# Altium footprint library TranDangKhoa-LIB.PcbLib: 1435 footprints (part 35 of 90)
Each footprint in its own frame and in the unit in brackets; x right, y up, seen from the top. Pads: shape width x height; smd on the part's side, far side on the other; paste and mask are expansions set on the pad; w line width, h text height; cw(c..) or ccw(c..) is an arc to the next point about the centre after c.
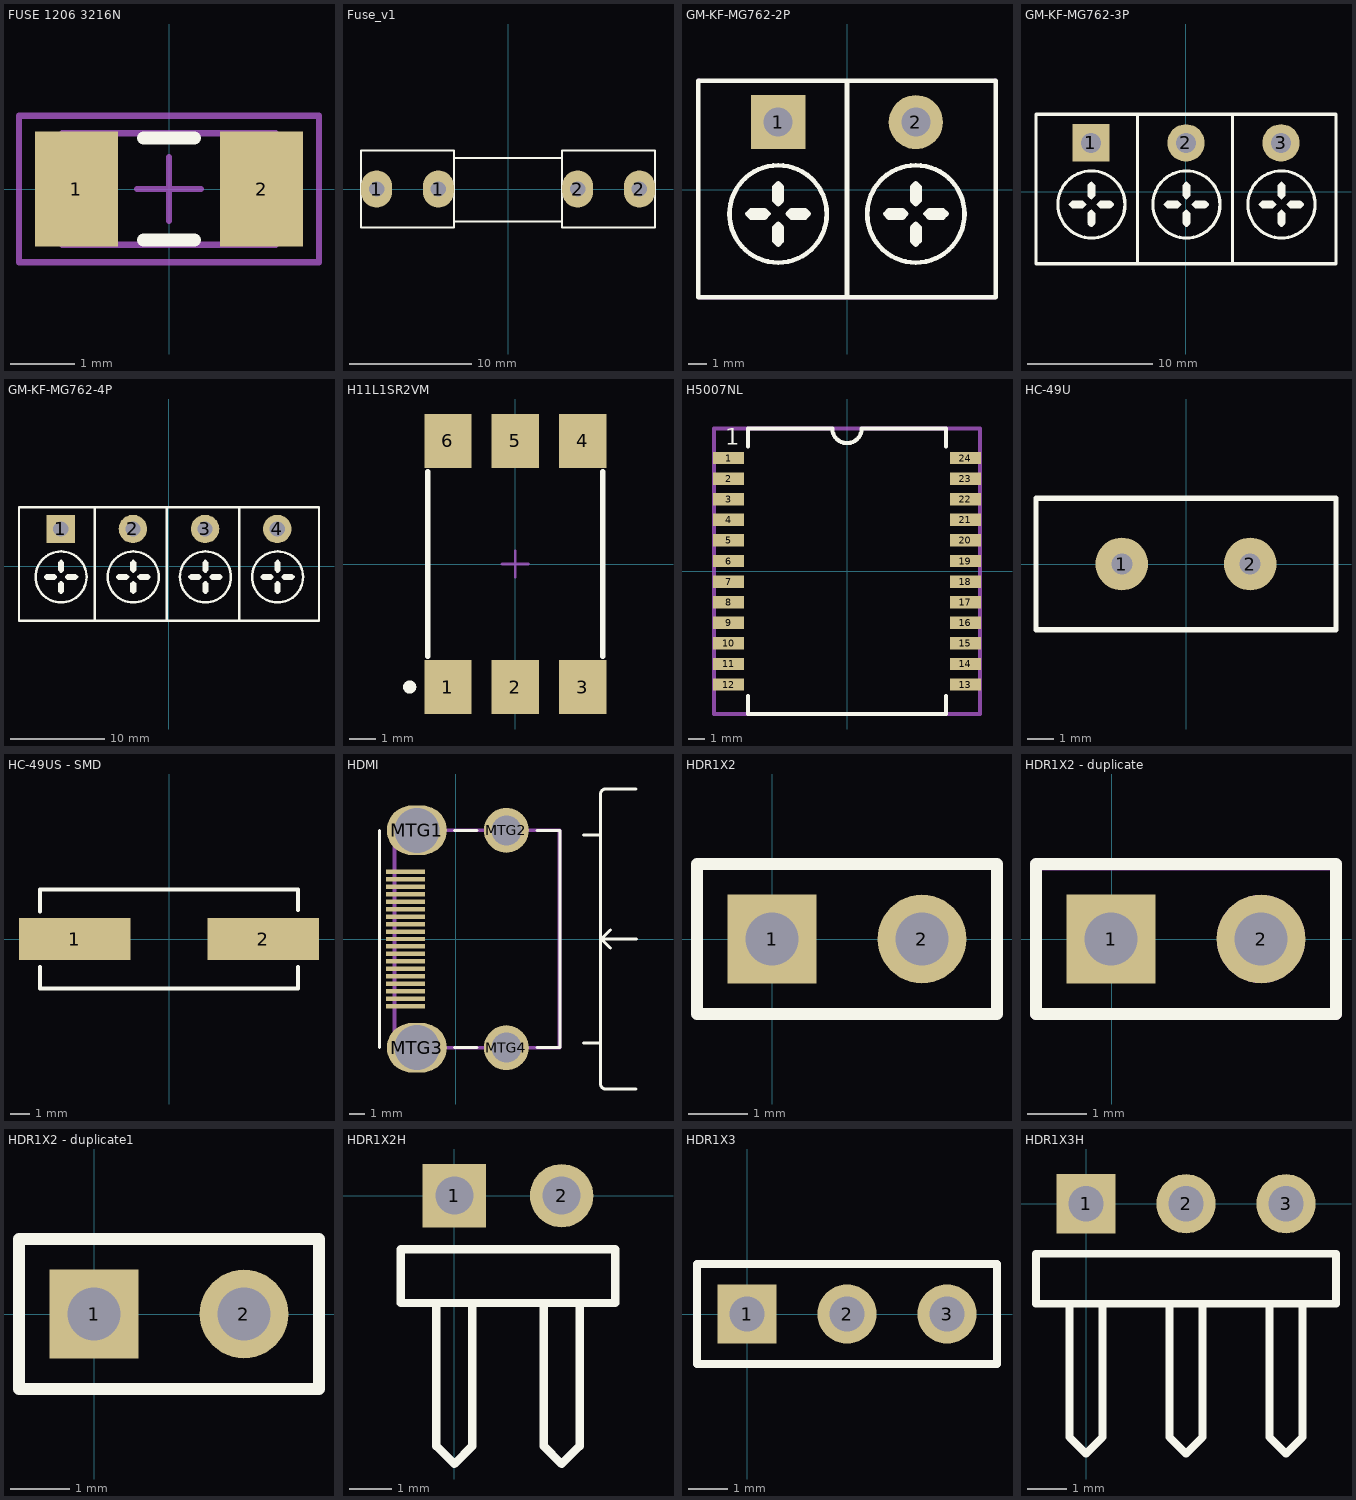
[diagram p34: the footprints below, top view; thin cyan lines are the x and y axes]

## FUSE 1206 3216N [mm] "Chip FUSE Body 3.2x1.6mm, IPC Medium Density"
height 0.71
pads (2):
  rect 1.3x1.8 smd: 1(-1.45,0) 2(1.45,0)
Top Overlay:
  lines w0.2: -0.4,-0.8 0.4,-0.8 ; -0.4,0.8 0.4,0.8
Mechanical 13:
  lines w0.1: -1.675,-0.875 1.675,-0.875 1.675,0.875 -1.675,0.875 -1.675,-0.875
Mechanical 15:
  lines w0.1: -0.5,0 0.5,0 ; 0,-0.5 0,0.5 ; -2.35,-1.15 2.35,-1.15 2.35,1.15 -2.35,1.15 -2.35,-1.15
3D body "1206 SMD Resistor.step": height 1, standoff 0, extent -1.571,-0.804 1.629,0.796

## Fuse_v1 [mil] "Fuse 10A, Cầu Chì, Fuse"
pads (4):
  oval 100x120 hole 50: 1(-425,0) 1(-225,0) 2(225,0) 2(425,0)
Top Overlay:
  lines w7: -175,-105 175,-105 ; -175,100 175,100 ; -475,-125 -475,125 -175,125 -175,-125 -475,-125 ; 175,-125 475,-125 475,125 175,125 175,-125
3D body "SW3dPS-Fuse Leg_2009.STEP": height 377.88, standoff -129.94, extent 219,-116.71 459,127
3D body "SW3dPS-Fuse Small 1A.STEP": height 370.39, standoff 169.61, extent -384.8,-98 390.8,102.79
3D body "SW3dPS-Fuse Leg_2009.STEP": height 377.88, standoff -129.94, extent -448,-117 -208,126.71

## GM-KF-MG762-2P [mm]
pads (2):
  rect 3x3 hole 1.6 paste-2539.97 mask+0.051: 1(-3.81,3.736)
  round 3 hole 1.6 paste-2539.97 mask+0.051: 2(3.81,3.736)
Top Overlay:
  circle w0.254: c3.81,-1.343 r2.693
  circle w0.254: c-3.81,-1.343 r2.693
  lines w0.254: -5.31,-1.144 -4.546,-1.144 -4.346,-1.343 ; -4.01,-2.843 -4.01,-2.079 -3.81,-1.879 ; -3.81,0.357 -4.01,0.156 -4.01,-0.608 -3.81,-0.808 ; -3.61,0.156 -3.61,-0.608 ; -2.111,-1.343 -2.309,-1.544 -3.073,-1.544 -3.274,-1.343 ; 0,-5.964 0,5.895 ; 2.31,-1.144 3.074,-1.144 3.274,-1.343 ; 3.61,-2.843 3.61,-2.079 3.81,-1.879 ; 3.81,0.357 3.61,0.156 3.61,-0.608 3.81,-0.808 ; 4.01,0.156 4.01,-0.608 ; 5.509,-1.343 5.311,-1.544 4.547,-1.544 4.346,-1.343 ; -5.51,-1.344 -4.346,-1.344 ; -5.51,-1.343 -5.31,-1.544 -4.546,-1.544 ; -5.509,-1.344 -5.311,-1.143 -4.546,-1.143 -4.346,-1.344 ; -4.546,-1.544 -4.346,-1.343 ; -4.546,-1.544 -4.346,-1.343 ; -3.81,-3.044 -3.809,-3.043 ; -3.809,-3.043 -3.809,-1.879 ; -3.809,-3.043 -4.01,-2.845 -4.01,-2.08 -3.809,-1.879 ; -3.81,-3.044 -3.61,-2.843 -3.61,-2.079 -3.81,-1.879 ; -3.81,-0.808 -3.61,-0.608 ; -3.81,-0.808 -3.81,0.356 -3.61,0.158 -3.61,-0.607 ; -3.81,-0.808 -3.61,-0.607 ; -3.274,-1.343 -3.074,-1.143 -2.31,-1.143 -2.11,-1.343 -3.274,-1.343 ; 2.11,-1.344 3.274,-1.344 ; 2.11,-1.343 2.31,-1.544 3.074,-1.544 ; 2.111,-1.344 2.309,-1.143 3.074,-1.143 3.274,-1.344 ; 3.074,-1.544 3.274,-1.343 ; 3.074,-1.544 3.274,-1.343 ; 3.81,-3.044 3.811,-3.043 ; 3.811,-3.043 3.811,-1.879 ; 3.811,-3.043 3.61,-2.845 3.61,-2.08 3.811,-1.879 ; 3.81,-3.044 4.01,-2.843 4.01,-2.079 3.81,-1.879 ; 3.81,-0.808 4.01,-0.608 ; 3.81,-0.808 3.81,0.356 4.01,0.158 4.01,-0.607 ; 3.81,-0.808 4.01,-0.607 ; 4.346,-1.343 4.546,-1.143 5.31,-1.143 5.51,-1.343 4.346,-1.343 ; -8.22,-5.964 8.22,-5.964 8.22,6.037 -8.22,6.037 -8.22,-5.964
Mechanical 15:
  region: 8.14,5.956 8.14,-5.893 0.03,-5.893 0,-5.864 0,-6.064 8.2,-6.064 8.3,-5.964 8.3,6.086 8.25,6.136 8.15,6.136
  region: -8.14,5.956 -8.14,-5.893 -0.03,-5.893 0,-5.864 0,-6.063 -8.2,-6.063 -8.3,-5.964 -8.3,6.086 -8.25,6.136 -8.15,6.136

## GM-KF-MG762-3P [mm]
pads (3):
  rect 3x3 hole 1.6 paste-2539.97 mask+0.051: 1(-7.605,3.928)
  round 3 hole 1.6 paste-2539.97 mask+0.051: 2(0.015,3.928) 3(7.635,3.928)
Top Overlay:
  circle w0.254: c7.67,-1.011 r2.693
  circle w0.254: c0.05,-1.011 r2.693
  circle w0.254: c-7.57,-1.011 r2.693
  lines w0.254: -9.269,-1.011 -9.071,-0.81 -8.306,-0.81 -8.106,-1.011 ; -9.07,-0.811 -8.306,-0.811 -8.106,-1.01 ; -7.77,-2.51 -7.77,-1.746 -7.57,-1.546 -7.37,-1.746 -7.37,-2.51 -7.57,-2.711 -7.569,-2.71 ; -7.57,0.69 -7.77,0.489 -7.77,-0.275 -7.57,-0.475 ; -7.37,0.489 -7.37,-0.274 ; -7.034,-1.01 -6.833,-1.211 -6.069,-1.211 -5.871,-1.01 ; -3.887,-5.758 -3.887,6.101 ; -1.649,-1.011 -1.451,-0.81 -0.686,-0.81 -0.486,-1.011 ; -1.45,-0.811 -0.686,-0.811 -0.486,-1.01 ; -0.15,-2.51 -0.15,-1.746 0.05,-1.546 0.25,-1.746 0.25,-2.51 0.05,-2.711 0.051,-2.71 ; 0.05,0.69 -0.15,0.489 -0.15,-0.275 0.05,-0.475 ; 0.25,0.489 0.25,-0.274 ; 0.586,-1.01 0.787,-1.211 1.551,-1.211 1.749,-1.01 ; 3.733,-5.758 3.733,6.101 ; 5.971,-1.011 6.169,-0.81 6.934,-0.81 7.134,-1.011 ; 6.17,-0.811 6.934,-0.811 7.134,-1.01 ; 7.47,-2.51 7.47,-1.746 7.67,-1.546 7.87,-1.746 7.87,-2.51 7.67,-2.711 7.671,-2.71 ; 7.67,0.69 7.47,0.489 7.47,-0.275 7.67,-0.475 ; 7.87,0.489 7.87,-0.274 ; 8.206,-1.01 8.407,-1.211 9.171,-1.211 9.369,-1.01 ; -12.015,-5.772 12.045,-5.772 12.045,6.229 -12.015,6.229 ; -12.015,-5.772 -12.015,6.229 ; -12.015,-5.772 -12.015,6.229 ; -8.306,-1.211 -8.106,-1.01 ; -8.306,-1.211 -9.07,-1.211 -9.27,-1.01 -8.106,-1.011 ; -8.306,-1.211 -8.106,-1.01 ; -7.57,-0.475 -7.37,-0.274 ; -7.57,-0.475 -7.57,0.689 -7.37,0.491 -7.37,-0.274 ; -7.57,-0.475 -7.37,-0.274 ; -7.569,-2.71 -7.569,-1.546 -7.77,-1.747 -7.77,-2.512 -7.569,-2.71 ; -0.686,-1.211 -0.486,-1.01 ; -0.686,-1.211 -1.45,-1.211 -1.65,-1.01 -0.486,-1.011 ; -0.686,-1.211 -0.486,-1.01 ; 0.05,-0.475 0.25,-0.274 ; 0.05,-0.475 0.05,0.689 0.25,0.491 0.25,-0.274 ; 0.05,-0.475 0.25,-0.274 ; 0.051,-2.71 0.051,-1.546 -0.15,-1.747 -0.15,-2.512 0.051,-2.71 ; 6.934,-1.211 7.134,-1.01 ; 6.934,-1.211 6.17,-1.211 5.97,-1.01 7.134,-1.011 ; 6.934,-1.211 7.134,-1.01 ; 7.67,-0.475 7.87,-0.274 ; 7.67,-0.475 7.67,0.689 7.87,0.491 7.87,-0.274 ; 7.67,-0.475 7.87,-0.274 ; 7.671,-2.71 7.671,-1.546 7.47,-1.747 7.47,-2.512 7.671,-2.71 ; -7.034,-1.01 -6.834,-0.81 -6.07,-0.81 -5.87,-1.01 -7.034,-1.01 ; 0.586,-1.01 0.786,-0.81 1.55,-0.81 1.75,-1.01 0.586,-1.01 ; 8.206,-1.01 8.406,-0.81 9.17,-0.81 9.37,-1.01 8.206,-1.01

## GM-KF-MG762-4P [mm]
pads (4):
  rect 3x3 hole 1.6 paste-2539.97 mask+0.051: 1(-11.393,3.924)
  round 3 hole 1.6 paste-2539.97 mask+0.051: 2(-3.773,3.924) 3(3.847,3.924) 4(11.467,3.924)
Top Overlay:
  drawing of 155 lines, arcs and shapes, not listed

## H11L1SR2VM [mil]
pads (6):
  rect 70x80 smd: 1(-100,-182.48) 2(0,-182.48) 3(100,-182.48) 4(100,182.48) 5(0,182.48) 6(-100,182.48)
Top Overlay:
  circle w9.84: c-156.69,-182.48 r4.92
  lines w7.87: -129.92,-136.81 -129.92,136.81 ; 129.92,-136.81 129.92,136.81
Mechanical 15:
  lines w3.94: -19.69,0 19.68,0 ; 0,-19.68 0,19.68
3D body "H11L3M.stp": height 156.56, standoff -1.58, extent -173.88,-196 175.88,189.83

## H5007NL [mil]
pads (24):
  rect 75x30 smd: 1(-287.5,275) 2(-287.5,225) 3(-287.5,175) 4(-287.5,125) 5(-287.5,75) 6(-287.5,25) 7(-287.5,-25) 8(-287.5,-75) 9(-287.5,-125) 10(-287.5,-175) 11(-287.5,-225) 12(-287.5,-275) 13(287.5,-275) 14(287.5,-225) 15(287.5,-175) 16(287.5,-125) 17(287.5,-75) 18(287.5,-25) 19(287.5,25) 20(287.5,75) 21(287.5,125) 22(287.5,175) 23(287.5,225) 24(287.5,275)
Top Overlay:
  lines w10: -240.16,-303.15 -240.16,-346.46 240.16,-346.46 240.16,-303.15 ; -240.16,303.15 -240.16,346.46 -37.66,346.46 ; -35.43,346.46 ccw(c0.01,346.46) 35.45,346.46 ; 37.66,346.46 240.16,346.46 240.16,303.15
  text "1" at -295.28,307.09 h40
Mechanical 16:
  circle w10: c-287.4,275.59 r3.94
  lines w10: -322.83,-346.46 -322.83,346.46 322.83,346.46 322.83,-346.46 -322.83,-346.46
Mechanical 29:
  text ".Designator" at -39.37,35.43 h60
3D body: height 216.93, standoff 0, extent -240.16,-346.46 240.16,346.46

## HC-49U [mm] "HC-49U XTAL"
height 13.49
pads (2):
  round 2 hole 0.8: 1(-2.44,0) 2(2.44,0)
Top Overlay:
  lines w0.2: -5.7,-2.5 -5.7,2.5 5.7,2.5 5.7,-2.5 -5.7,-2.5
3D body "HC-49U.STEP": height 13.49, standoff -2.99, extent -5.525,-2.325 5.525,2.325

## HC-49US - SMD [mm] "HC-49US XTAL"
height 4.3
pads (2):
  rect 5.6x2.1 smd: 1(-4.75,0) 2(4.75,0)
Top Overlay:
  lines w0.2: -6.5,-1.4 -6.5,-2.5 6.5,-2.5 6.5,-1.41 ; -6.5,1.39 -6.5,2.5 6.5,2.5 6.5,1.45
3D body "HC-49US-SMD.STEP": height 4.25, standoff 0, extent -6.35,-2.4 6.35,2.4

## HDMI [mm]
pads (23):
  rect 2.6x0.3 smd mask+0.025: 1(-3.36,4.5) 2(-3.36,4) 3(-3.36,3.5) 4(-3.36,3) 5(-3.36,2.5) 6(-3.36,2) 7(-3.36,1.5) 8(-3.36,1) 9(-3.36,0.5) 10(-3.36,0) 11(-3.36,-0.5) 12(-3.36,-1) 13(-3.36,-1.5) 14(-3.36,-2) 15(-3.36,-2.5) 16(-3.36,-3) 17(-3.36,-3.5) 18(-3.36,-4) 19(-3.36,-4.5)
  oval 4x3.3 hole 3: MTG1(-2.6,7.25) MTG3(-2.6,-7.25)
  round 3 hole 2: MTG2(3.36,7.25) MTG4(3.36,-7.25)
Top Overlay:
  lines w0.2: -5.1,-7.25 -5.1,7.25 ; -0.1,-7.25 1.4,-7.25 ; -0.1,7.25 1.4,7.25 ; 5.4,-7.25 6.9,-7.25 6.95,-7.2 6.95,7.25 ; 5.4,7.25 6.9,7.25 ; 8.5,-6.95 9.65,-6.95 ; 8.5,6.95 9.65,6.95 ; 9.95,10 12,10 ; 10,10 ccw(c9.975,9.675) 9.65,9.7 9.65,-9.7 ccw(c9.975,-9.675) 10,-10 12,-10 ; 10.3,-0.6 9.7,0 ; 10.3,0.6 9.7,0 ; 12.05,0 9.7,0
Mechanical 1:
  text "plastic may go over the board edge" at -6.6,9.6 h0.5
  text "doesnt fit on one place. Bottom" at -6.5,10.8 h0.5
  text "NOTE: Holes are big and connector" at -6.5,12 h0.5
Mechanical 16:
  lines w0.254: -4.1,-7.25 6.9,-7.25 6.9,7.25 -4.1,7.25 -4.1,-7.25
Mechanical 29:
  text ".Designator" at 0.5,2.3 h1.52
3D body "471510001.stp": height 6.28, standoff -2.1, extent -4.2,-7.5 7.95,7.5

## HDR1X2 [mm] "Connector; Header; 2 Position"
pads (2):
  rect 1.5x1.5 hole 0.9: 1(0,0)
  round 1.5 hole 0.9: 2(2.54,0)
Top Overlay:
  lines w0.2: -1.27,-1.27 3.81,-1.27 3.81,1.27 -1.27,1.27 -1.27,-1.27
3D body: height 1.5, standoff 0, extent -1.27,-1.27 1.27,1.27
3D body: height 7, standoff -1, extent -0.406,-0.406 0.39,0.392
3D body: height 7, standoff -1, extent 2.134,-0.406 2.93,0.392
3D body: height 1.5, standoff 0, extent 1.27,-1.27 3.81,1.27

## HDR1X2 - duplicate [mm]
pads (2):
  rect 1.5x1.5 hole 0.9: 1(-0.01,0.007)
  round 1.5 hole 0.9: 2(2.53,0.007)
Top Overlay:
  lines w0.2: -1.28,-1.263 3.8,-1.263 3.8,1.277 -1.28,1.277 -1.28,-1.263
Mechanical 7:
  circle w0.2: c2.53,0.007 r0.648
  lines w0.2: -1.28,-1.263 -1.28,1.27 3.8,1.27 3.8,-1.263 -1.28,-1.263 ; -0.645,-0.628 0.625,-0.628 0.625,0.642 -0.645,0.642 -0.645,-0.628
3D body "1x2HDR.stp": height 8.41, standoff -2.52, extent -1.27,-1.27 3.81,1.27

## HDR1X2 - duplicate1 [mm]
height 1
pads (2):
  rect 1.5x1.5 hole 0.9: 1(0,0)
  round 1.5 hole 0.9: 2(2.54,0)
Top Overlay:
  lines w0.2: -1.27,-1.27 -1.27,1.27 3.81,1.27 3.81,-1.27 -1.27,-1.27

## HDR1X2H [mm] "Connector; Header; 2 Position; Right Angle"
pads (2):
  rect 1.5x1.5 hole 0.9: 1(0,0)
  round 1.5 hole 0.9: 2(2.54,0)
Top Overlay:
  lines w0.2: -0.423,-2.54 -0.423,-5.927 0,-6.35 0.423,-5.927 0.423,-2.54 ; 2.117,-2.54 2.117,-5.927 2.54,-6.35 2.963,-5.927 2.963,-2.54 ; -1.27,-2.54 3.81,-2.54 3.81,-1.27 -1.27,-1.27 -1.27,-2.54
3D body "User Library-0_1inch 2 pin strip right angle.step": height 4.33, standoff -3, extent -1.27,-7 3.81,1.27

## HDR1X3 [mm] "Connector; Header; 3 Position"
pads (3):
  rect 1.5x1.5 hole 0.9: 1(0,0)
  round 1.5 hole 0.9: 2(2.54,0) 3(5.08,0)
Top Overlay:
  lines w0.2: -1.27,-1.27 -1.27,1.27 ; -1.27,-1.27 6.35,-1.27 6.35,1.27 -1.27,1.27 ; -1.27,-1.27 -1.27,1.27
3D body: height 1.5, standoff 0, extent -1.27,-1.27 1.27,1.27
3D body: height 7, standoff -1, extent -0.406,-0.406 0.39,0.392
3D body: height 1.5, standoff 0, extent 1.27,-1.27 3.81,1.27
3D body: height 7, standoff -1, extent 2.134,-0.406 2.93,0.392
3D body: height 1.5, standoff 0, extent 3.81,-1.27 6.35,1.27
3D body: height 7, standoff -1, extent 4.674,-0.406 5.47,0.392

## HDR1X3H [mm] "Connector; Header; 3 Position; Right Angle"
pads (3):
  rect 1.5x1.5 hole 0.9: 1(0,0)
  round 1.5 hole 0.9: 2(2.54,0) 3(5.08,0)
Top Overlay:
  lines w0.2: -0.423,-2.54 -0.423,-5.927 0,-6.35 0.423,-5.927 0.423,-2.54 ; 2.117,-2.54 2.117,-5.927 2.54,-6.35 2.963,-5.927 2.963,-2.54 ; 4.657,-2.54 4.657,-5.927 5.08,-6.35 5.503,-5.927 5.503,-2.54 ; -1.27,-2.54 6.35,-2.54 6.35,-1.27 -1.27,-1.27 -1.27,-2.54
3D body "User Library-0_1inch 3pin strip right angle.step": height 4.33, standoff -3, extent -1.27,-7 6.35,1.27